# Altium footprint library connectors.PCBLIB: 188 footprints (part 11 of 12)
Each footprint in its own frame and in the unit in brackets; x right, y up, seen from the top. Pads: shape width x height; smd on the part's side, far side on the other; paste and mask are expansions set on the pad; w line width, h text height; cw(c..) or ccw(c..) is an arc to the next point about the centre after c.
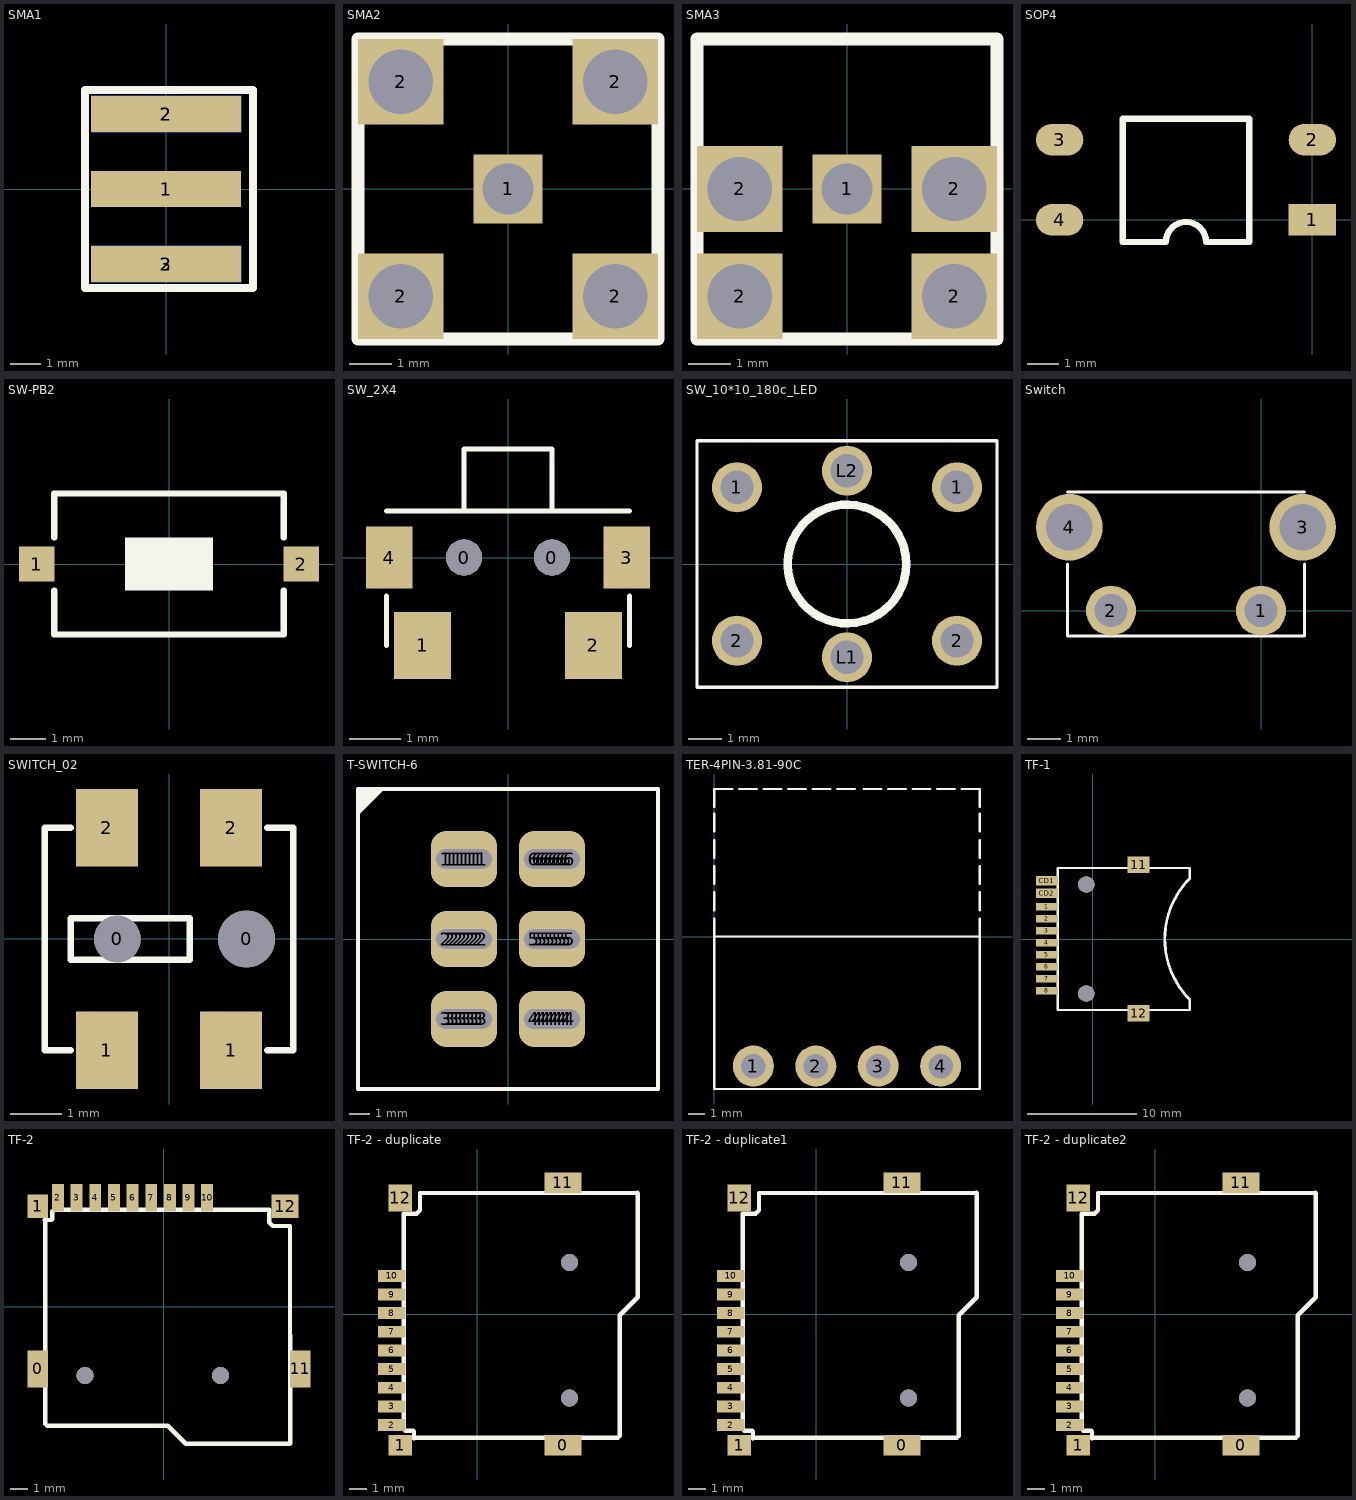
[diagram p10: the footprints below, top view; thin cyan lines are the x and y axes]

## SMA1 [mm]
pads (5):
  rect 5x1.2 smd: 1(0,0) 2(0,-2.5) 2(0,2.5)
  rect 5x1.2 smd far side: 2(0,2.5) 3(0,-2.5)
Top Overlay:
  lines w0.254: -2.7,-3.3 2.9,-3.3 2.9,3.3 -2.7,3.3 -2.7,-3.3

## SMA2 [mm]
pads (5):
  rect 1.6x1.6 hole 1.2: 1(0,0)
  rect 2x2 hole 1.5: 2(-2.5,-2.5) 2(-2.5,2.5) 2(2.5,-2.5) 2(2.5,2.5)
Top Overlay:
  lines w0.305: -3.5,-3.5 -3.5,3.5 3.5,3.5 3.5,-3.5 -3.5,-3.5

## SMA3 [mm]
pads (5):
  rect 1.6x1.6 hole 1.2: 1(0,0)
  rect 2x2 hole 1.5: 2(-2.5,-2.5) 2(-2.5,0) 2(2.5,-2.5) 2(2.5,0)
Top Overlay:
  lines w0.305: -3.5,-3.5 3.5,-3.5 3.5,3.5 -3.5,3.5 -3.5,-3.5

## SOP4 [mm]
pads (4):
  rect 1.5x1 smd: 1(0,0)
  oval 1.5x1 smd: 2(0,2.54) 3(-8,2.54) 4(-8,0)
Top Overlay:
  lines w0.2: -6,-0.7 -4.635,-0.7 cw(c-4,-0.7) -3.365,-0.7 -2,-0.7 -2,3.2 -6,3.2 -6,-0.7

## SW-PB2 [mm]
pads (2):
  rect 1x1 smd: 1(-3.75,0) 2(3.75,0)
Top Overlay:
  rectangle: -1.25,-0.75 1.25,0.75
  lines w0.178: -3.25,-0.75 -3.25,-2 3.25,-2 3.25,-0.75 ; -3.25,0.75 -3.25,2 3.25,2 3.25,0.75
3D body: height 2.49, standoff 0.1, extent -4.025,-1.778 4.115,1.822

## SW_2X4 [mm]
pads (6):
  round 0.7 hole 0.7: 0(-0.85,0) 0(0.85,0)
  rect 1.1x1.3 smd: 1(-1.65,-1.7) 2(1.65,-1.7)
  rect 0.9x1.2 smd: 3(2.3,0) 4(-2.3,0)
Top Overlay:
  lines w0.1: -2.35,-1.7 -2.35,-0.75 ; -2.35,0.9 2.35,0.9 ; -0.85,0.9 -0.85,2.1 0.85,2.1 0.85,0.9 ; 2.35,-1.7 2.35,-0.75

## SW_10*10_180c_LED [mm]
height 6.86
pads (6):
  round 1.5 hole 1: 1(-3.3,2.3) 1(3.3,2.3) 2(-3.3,-2.3) 2(3.3,-2.3) L1(0,-2.8) L2(0,2.8)
Top Overlay:
  circle w0.254: c0,0 r1.78
  lines w0.1: -4.5,-3.7 4.5,-3.7 4.5,3.7 -4.5,3.7 -4.5,-3.7

## Switch [mm]
pads (4):
  round 1.5 hole 1: 1(0,0) 2(-4.5,0)
  round 2 hole 1.4: 3(1.25,2.5) 4(-5.75,2.5)
Top Overlay:
  lines w0.1: -5.806,1.397 -5.806,-0.762 1.306,-0.762 1.306,1.397 ; -5.806,3.556 1.306,3.556

## SWITCH_02 [mm]
pads (6):
  round 0.9 hole 0.9: 0(-1,0)
  round 1.1 hole 1.1: 0(1.5,0)
  rect 1.2x1.5 smd: 1(-1.2,-2.15) 1(1.2,-2.15) 2(-1.2,2.15) 2(1.2,2.15)
Top Overlay:
  lines w0.127: -1.9,-2.15 -2.4,-2.15 -2.4,2.15 -1.9,2.15 ; 1.9,-2.15 2.4,-2.15 2.4,2.15 1.9,2.15 ; -1.9,-0.4 -1.9,0.4 0.4,0.4 0.4,-0.4 -1.9,-0.4

## T-SWITCH-6 [mm]
pads (60):
  oval 1.5x2.8 hole 1: 1(-3.1,4) 1(-2.9,4) 1(-2.7,4) 1(-2.5,4) 1(-2.3,4) 1(-2.1,4) 1(-1.9,4) 1(-1.7,4) 1(-1.5,4) 1(-1.3,4) 2(-3.1,0) 2(-2.9,0) 2(-2.7,0) 2(-2.5,0) 2(-2.3,0) 2(-2.1,0) 2(-1.9,0) 2(-1.7,0) 2(-1.5,0) 2(-1.3,0) 3(-3.1,-4) 3(-2.9,-4) 3(-2.7,-4) 3(-2.5,-4) 3(-2.3,-4) 3(-2.1,-4) 3(-1.9,-4) 3(-1.7,-4) 3(-1.5,-4) 3(-1.3,-4) 4(1.3,-4) 4(1.5,-4) 4(1.7,-4) 4(1.9,-4) 4(2.1,-4) 4(2.3,-4) 4(2.5,-4) 4(2.7,-4) 4(2.9,-4) 4(3.1,-4) 5(1.3,0) 5(1.5,0) 5(1.7,0) 5(1.9,0) 5(2.1,0) 5(2.3,0) 5(2.5,0) 5(2.7,0) 5(2.9,0) 5(3.1,0) 6(1.3,4) 6(1.5,4) 6(1.7,4) 6(1.9,4) 6(2.1,4) 6(2.3,4) 6(2.5,4) 6(2.7,4) 6(2.9,4) 6(3.1,4)
Top Overlay:
  lines w0.2: -7.5,6.3 -6.3,7.5 ; -7.5,6.5 -6.5,7.5 ; -7.5,6.7 -6.7,7.5 ; -7.5,6.9 -6.9,7.5 ; -7.5,7.1 -7.1,7.5 ; -7.5,7.3 -7.3,7.5 ; -7.5,-7.5 -7.5,0 -7.5,7.5 7.5,7.5 7.5,-7.5 -7.5,-7.5

## TER-4PIN-3.81-90C [mm]
pads (4):
  round 2.5 hole 1.5: 1(2.385,-7.9) 2(6.195,-7.9) 3(10.005,-7.9) 4(13.815,-7.9)
Top Overlay:
  lines w0.127: 0,1.1 0,0 ; 0,1.6 0,2.7 ; 0,3.2 0,4.3 ; 0,4.8 0,5.9 ; 0,6.4 0,7.5 ; 0,7.9 0,9 1.1,9 ; 1.5,9 2.6,9 ; 3,9 4.1,9 ; 4.5,9 5.6,9 ; 6,9 7.1,9 ; 7.5,9 8.6,9 ; 9.105,9 10.205,9 ; 10.6,9 11.7,9 ; 12.1,9 13.2,9 ; 13.6,9 14.7,9 ; 15.1,9 16.2,9 16.2,7.9 ; 16.2,1.1 16.2,0 ; 16.2,1.6 16.2,2.7 ; 16.2,3.2 16.2,4.3 ; 16.2,4.8 16.2,5.9 ; 16.2,6.4 16.2,7.5 ; 0,0 16.2,0 ; 0,0 0,-9.3 16.2,-9.3 16.2,0

## TF-1 [mm]
pads (14):
  rect 2x0.7 smd: 1(-4.2,2.95) 2(-4.2,1.85) 3(-4.2,0.75) 4(-4.2,-0.35) 5(-4.2,-1.45) 6(-4.2,-2.55) 7(-4.2,-3.65) 8(-4.2,-4.75)
  rect 2x1.5 smd: 11(4.2,6.82) 12(4.2,-6.82)
  rect 2x0.85 smd: CD1(-4.2,5.35) CD2(-4.2,4.2)
  round 1.5 hole 1.5 unplated: ""(-0.6,-5)
  round 1.5 hole 1.5: ""(-0.6,5)
Top Overlay:
  lines w0.2: 8.9,-5.55 8.9,-6.515 -3.2,-6.515 -3.2,6.515 8.9,6.515 8.9,5.55
  lines w0.254: 8.9,-5.55 cw(c14.45,0) 8.9,5.55

## TF-2 [mm]
pads (13):
  rect 1.2x2.2 smd: 0(-7.445,-3.678) 11(8.055,-3.678)
  rect 1.2x1.4 smd: 1(-7.445,5.922)
  rect 0.7x1.6 smd: 2(-6.245,6.422) 3(-5.145,6.422) 4(-4.045,6.422) 5(-2.945,6.422) 6(-1.845,6.422) 7(-0.745,6.422) 8(0.355,6.422) 9(1.455,6.422) 10(2.555,6.422)
  rect 1.6x1.4 smd: 12(7.155,5.922)
via 3.355,-4.078 diameter 1 hole 1
via -4.645,-4.078 diameter 1 hole 1
Top Layer:
  lines w0.254: -7.039,5.11 -6.988,5.059
Top Overlay:
  lines w0.254: -7.039,5.11 -6.632,5.11 -6.582,5.161 -6.582,5.618 -6.48,5.72 6.22,5.72 6.22,4.958 6.423,4.754 7.439,4.754 7.455,-8.078 ; -6.988,5.059 -6.988,-6.93 -6.886,-7.031 0.226,-7.031 1.292,-8.098 7.435,-8.098

## TF-2 - duplicate [mm]
pads (13):
  rect 2.2x1.2 smd: 0(5.05,-7.75) 11(5.05,7.75)
  rect 1.4x1.2 smd: 1(-4.55,-7.75)
  rect 1.6x0.7 smd: 2(-5.05,-6.55) 3(-5.05,-5.45) 4(-5.05,-4.35) 5(-5.05,-3.25) 6(-5.05,-2.15) 7(-5.05,-1.05) 8(-5.05,0.05) 9(-5.05,1.15) 10(-5.05,2.25)
  rect 1.4x1.6 smd: 12(-4.55,6.85)
via 5.45,3.05 diameter 1 hole 1
via 5.45,-4.95 diameter 1 hole 1
Top Layer:
  lines w0.254: -3.738,-7.344 -3.688,-7.293
Top Overlay:
  lines w0.254: -3.738,-7.344 -3.738,-6.937 -3.789,-6.886 -4.246,-6.886 -4.348,-6.785 -4.348,5.915 -3.586,5.915 -3.383,6.118 -3.383,7.134 9.45,7.15 ; -3.688,-7.293 8.301,-7.293 8.403,-7.191 8.403,-0.079 9.47,0.988 9.47,7.13

## TF-2 - duplicate1 [mm]
pads (13):
  rect 2.2x1.2 smd: 0(5.05,-7.75) 11(5.05,7.75)
  rect 1.4x1.2 smd: 1(-4.55,-7.75)
  rect 1.6x0.7 smd: 2(-5.05,-6.55) 3(-5.05,-5.45) 4(-5.05,-4.35) 5(-5.05,-3.25) 6(-5.05,-2.15) 7(-5.05,-1.05) 8(-5.05,0.05) 9(-5.05,1.15) 10(-5.05,2.25)
  rect 1.4x1.6 smd: 12(-4.55,6.85)
via 5.45,-4.95 diameter 1 hole 1
via 5.45,3.05 diameter 1 hole 1
Top Layer:
  lines w0.254: -3.738,-7.344 -3.688,-7.293
Top Overlay:
  lines w0.254: -3.738,-7.344 -3.738,-6.937 -3.789,-6.886 -4.246,-6.886 -4.348,-6.785 -4.348,5.915 -3.586,5.915 -3.383,6.118 -3.383,7.134 9.45,7.15 ; -3.688,-7.293 8.301,-7.293 8.403,-7.191 8.403,-0.079 9.47,0.988 9.47,7.13

## TF-2 - duplicate2 [mm]
pads (13):
  rect 2.2x1.2 smd: 0(5.05,-7.75) 11(5.05,7.75)
  rect 1.4x1.2 smd: 1(-4.55,-7.75)
  rect 1.6x0.7 smd: 2(-5.05,-6.55) 3(-5.05,-5.45) 4(-5.05,-4.35) 5(-5.05,-3.25) 6(-5.05,-2.15) 7(-5.05,-1.05) 8(-5.05,0.05) 9(-5.05,1.15) 10(-5.05,2.25)
  rect 1.4x1.6 smd: 12(-4.55,6.85)
via 5.45,-4.95 diameter 1 hole 1
via 5.45,3.05 diameter 1 hole 1
Top Layer:
  lines w0.254: -3.738,-7.344 -3.688,-7.293
Top Overlay:
  lines w0.254: -3.738,-7.344 -3.738,-6.937 -3.789,-6.886 -4.246,-6.886 -4.348,-6.785 -4.348,5.915 -3.586,5.915 -3.383,6.118 -3.383,7.134 9.45,7.15 ; -3.688,-7.293 8.301,-7.293 8.403,-7.191 8.403,-0.079 9.47,0.988 9.47,7.13